# Altium integrated library PlantiumIntegratedLibrary.IntLib: 638 symbols (part 3 of 6) (continued)
## SC-A20-BGA-X (continued)

## SC-AD7195BCP
designator U?, comment AD7195BCPZ  (value not drawn)
1 Channel AFE 24 Bit 32-LFCSP (5x5); Manufacturer: Analog Devices Inc.; Working Temperature: -40°C to +105°C; Temperature Coefficient: NC; Short Description: IC AFE 1 CHAN 24BIT 32LFCSP; Ratings: ROHS3; EAR99; 8542.39.0001; Frequency: 4.92MHz; Current: 6mA; Voltage: 5V / 2.7V-5V; Value: 24 Bits; Manufacturer Part Number: AD7195BCPZ; Mounting: SMD; Power: NC; Type: Sigma-Delta; Alternate Part Number 1: *; Alternate Part Number 2: *; Tolerance: NC; Revision Date: 04/05/2023; Package Reference: 32-LFCSP (5x5); ComponentLink1Description: Datasheet; ComponentLink1URL: https://www.analog.com/media/en/technical-documentation/data-sheets/AD7195.pdf; ComponentLink2Description: Reference design; ComponentLink2URL: https://www.analog.com/media/en/reference-design-documentation/reference-designs/CN0155.pdf
footprint CP_32_11_ADI-M
pins: 1 ACX2 (out), 2 ~{ACX2} (out), 3 ACX1 (out), 4 ~{ACX1} (out), 5 AVDD (power), 6 AGND (power), 7 NC, 8 AINCOM (in), 9 AIN1 (in), 10 AIN2 (in), 11 NC, 12 NC, 13 NC, 14 NC, 15 AIN3 (in), 16 AIN4 (in), 17 REFIN(+) (in), 18 REFIN(-) (in), 19 NC, 20 BPDSW, 21 AGND (power), 22 DGND (power), 23 AVDD (power), 24 DVDD (power), 25 ~{SYNC} (in), 26 NC, 27 DOUT/~{RDY} (out), 28 DIN (in), 29 MCLK1, 30 MCLK2, 31 SCLK (in), 32 ~{CS} (in), HTAB EPAD

## SC-AD8574ARU
designator U?
Zero-Drift Amplifier 4 Circuit Rail-to-Rail 14-TSSOP; Manufacturer Part Number: AD8574ARUZ; Manufacturer: Analog Devices Inc.; Working Temperature: -40°C ~ 125°C; Temperature Coefficient: NC; Short Description: IC OPAMP ZER-DRIFT 4CIRC 14TSSOP; Ratings: REACH, ROHS3; Voltage: 2.7V ~ 5V; Value: NC; Mounting: SMT; Power: NC; Type: NC; Frequency: NC; Alternate Part Number 1: *; Alternate Part Number 2: *; Tolerance: NC; Current: NC; Revision Date: 03/08/21; Package Reference: TSSOP-14
footprint TSSOP-14 (Footprint not found)
pins: 1 OUTA, 2 -INA, 3 +INA, 4 +V, 5 +INB, 6 -INB, 7 OUTB, 8 OUTC, 9 -INC, 10 +INC, 11 -V, 12 +IND, 13 -IND, 14 OUTD

## SC-AD8601ART
designator U?
General Purpose Amplifier 1 Circuit Rail-to-Rail SOT-23-5; Manufacturer Part Number: AD8601ARTZ-REEL7; Manufacturer: Analog Devices Inc.; Working Temperature: -40°C ~ 125°C; Temperature Coefficient: NC; Short Description: OPERATIONAL AMPLIFIER, 2100UV OF; Ratings: ND; Voltage: 2.7V ~ 5.5V; Value: NC; Mounting: SMT; Power: NC; Type: NC; Frequency: NC; Alternate Part Number 1: *; Alternate Part Number 2: *; Tolerance: NC; Current: NC; Revision Date: 03/08/21; Package Reference: SOT-23-5
footprint SOT-23-5 (Footprint not found)
pins: 1 OUT A, 2 V-, 3 +IN, 4 -IN, 5 V+

## SC-AD8602ARM
designator U?
CMOS Amplifier 2 Circuit Rail-to-Rail 8-MSOP; Manufacturer Part Number: AD8602ARMZ-REEL; Manufacturer: Analog Devices Inc.; Working Temperature: -40°C ~ 125°C; Temperature Coefficient: NC; Short Description: IC OPAMP GP 2 CIRCUIT 8MSOP; Ratings: REACH, ROHS3; Voltage: 2.7V ~ 5.5V; Value: NC; Mounting: SMT; Power: NC; Type: NC; Frequency: NC; Alternate Part Number 1: *; Alternate Part Number 2: *; Tolerance: NC; Current: NC; Revision Date: 03/08/21; Package Reference: MSOP-8
footprint MSOP-8 (Footprint not found)
pins: 1 OUT A, 2 -IN A, 3 +IN A, 4 V-, 5 +IN B, 6 -IN B, 7 OUT B, 8 V+

## SC-AD8639ACPZ
designator U?
Chopper (Zero-Drift) Amplifier 2 Circuit Rail-to-Rail 8-LFCSP-WD (3x3); Manufacturer Part Number: AD8639ACPZ; Manufacturer: Analog Devices Inc.; Working Temperature: -40°C ~ 125°C; Temperature Coefficient: NC; Short Description: ND; Ratings: REACH, ROHS3; Voltage: 5V ~ 16V, ±2.5V ~ 8V; Value: NC; Mounting: SMT; Power: NC; Type: NC; Frequency: NC; Alternate Part Number 1: *; Alternate Part Number 2: *; Tolerance: NC; Current: NC; Revision Date: 24/08/21; Package Reference: MSOP-8
footprint DFN-8_3x3
pins: 1 VoutA, 2 VinA-, 3 VinA+, 4 Vss, 5 Vinb+, 6 Vinb-, 7 VoutB, 8 Vdd, 9 EP

## SC-AD8639ARM
designator U?
Chopper (Zero-Drift) Amplifier 2 Circuit Rail-to-Rail 8-MSOP; Manufacturer Part Number: AD8639ARMZ-REEL; Manufacturer: Analog Devices Inc.; Working Temperature: -40°C ~ 125°C; Temperature Coefficient: NC; Short Description: ND; Ratings: REACH, ROHS3; Voltage: 5V ~ 16V, ±2.5V ~ 8V; Value: NC; Mounting: SMT; Power: NC; Type: NC; Frequency: NC; Alternate Part Number 1: *; Alternate Part Number 2: *; Tolerance: NC; Current: NC; Revision Date: 03/08/21; Package Reference: MSOP-8
footprint MSOP-8
pins: 1 VoutA, 2 VinA-, 3 VinA+, 4 Vss, 5 Vinb+, 6 Vinb-, 7 VoutB, 8 Vdd

## SC-AD8639ARZ
designator U?
Chopper (Zero-Drift) Amplifier 2 Circuit Rail-to-Rail 8-SOIC; Manufacturer Part Number: AD8639ARZ; Manufacturer: Analog Devices Inc.; Working Temperature: -40°C ~ 125°C; Temperature Coefficient: NC; Short Description: ND; Ratings: REACH, ROHS3; Voltage: 5V ~ 16V, ±2.5V ~ 8V; Value: NC; Mounting: SMT; Power: NC; Type: NC; Frequency: NC; Alternate Part Number 1: *; Alternate Part Number 2: *; Tolerance: NC; Current: NC; Revision Date: 24/08/21; Package Reference: SOIC-8N
footprint SOIC-8N
pins: 1 VoutA, 2 VinA-, 3 VinA+, 4 Vss, 5 Vinb+, 6 Vinb-, 7 VoutB, 8 Vdd

## SC-ADG706BRU
designator U?
1 Circuit IC Switch 16:1 4.5Ohm 28-TSSOP; Manufacturer Part Number: ADG706BRUZ; Manufacturer: Analog Devices Inc.; Working Temperature: -40°C ~ 85°C (TA); Temperature Coefficient: NC; Short Description: IC MULTIPLEXER 16X1 28TSSOP; Ratings: REACH, ROHS3; Voltage: 1.8V ~ 5.5V; Value: NC; Mounting: SMT; Power: NC; Type: NC; Frequency: NC; Alternate Part Number 1: *; Alternate Part Number 2: *; Tolerance: NC; Current: NC; Revision Date: 03/08/21; Package Reference: TSSOP-28
footprint TSSOP-28 (Footprint not found)
pins: 1 VDD, 2 NC, 3 NC, 4 S16, 5 S15, 6 S14, 7 S13, 8 S12, 9 S11, 10 S10, 11 S9, 12 GND, 13 NC, 14 A3, 15 A2, 16 A1, 17 A0, 18 EN, 19 S1, 20 S2, 21 S3, 22 S4, 23 S5, 24 S6, 25 S7, 26 S8, 27 VSS, 28 D

## SC-ADR445BRZ
designator U?
Series Voltage Reference IC ±0.04% 8-SOIC; Manufacturer Part Number: ADR445BRZ; Manufacturer: Analog Devices Inc.; Working Temperature: -40°C ~ 125°C (TA); Temperature Coefficient: NC; Short Description: IC VREF SERIES 0.04% 8SOIC; Ratings: REACH, ROHS3; Voltage: 5.5V ~ 18V; Value: NC; Mounting: SMT; Power: NC; Type: NC; Frequency: NC; Alternate Part Number 1: *; Alternate Part Number 2: *; Tolerance: NC; Current: NC; Revision Date: 03/08/21; Package Reference: SOIC-8N
footprint SOIC-8N (Footprint not found)
pins: 1 TP, 2 VIN, 3 NC, 4 GND, 5 TRIM, 6 VOUT, 7 NC, 8 TP

## SC-ADS1115BQ
designator U?, comment ADS1115-Q1
Automotive 16-Bit 860SPS 4-Ch Delta-Sigma ADC With PGA, Oscillator, VREF, Comparator, and I2C; Manufacturer_Name: Texas Instruments; Manufacturer_Part_Number: ADS1115BQDGSRQ1; Geometry.Height: 1.1mm; Mouser Part Number: 595-ADS1115BQDGSRQ1; Datasheet Link: http://www.ti.com/lit/gpn/ads1115-q1
footprint VSSOP-10
pins: 1 ADDR (in), 2 ALERT/RDY, 3 GND, 4 AIN0 (in), 5 AIN1 (in), 6 AIN2 (in), 7 AIN3 (in), 8 VDD, 9 SDA, 10 SCL

## SC-ADS1235QW
designator U?
24 Bit Analog to Digital Converter 3, 5 Input 1 Sigma-Delta 32-VQFN (5x5); Manufacturer Part Number: ADS1235QWRHMRQ1; Manufacturer: Texas Instruments; Working Temperature: -40°C ~ 125°C; Temperature Coefficient: NC; Short Description: IC ADC 24BIT SIGMA-DELTA 32VQFNP; Voltage: 2.7V ~ 5.25V; Value: NC; Mounting: Surface Mount; Power: NC; Ratings: *; Type: NC; Frequency: NC; Alternate Part Number 1: *; Alternate Part Number 2: *; Tolerance: NC; Current: NC; Revision Date: *; Package Reference: 32-VQFN (5x5)
footprint VQFN-32_5x5 (32-VFQFN Exposed Pad)
pins: 1 NC, 2 CAPP (out), 3 CAPN (out), 4 AVDD (power), 5 AVSS, 6 NC, 7 ~{PWDN} (in), 8 ~{RESET} (in), 9 START (in), 10 ~{CS} (in), 11 SCLK (in), 12 DIN (in), 13 ~{DRDY} (out), 14 DOUT/~{DRDY} (out), 15 BYPASS (out), 16 DGND, 17 DVDD (power), 18 CLKIN (in), 19 NC, 20 NC, 21 NC, 22 NC, 23 NC, 24 NC, 25 AIN5 (in), 26 AIN4 (in), 27 AIN3 (io), 28 AIN2 (io), 29 AIN1 (io), 30 AIN0 (io), 31 REFN0 (io), 32 REFP0 (io), 33 AVSS

## SC-ADUM4195
designator U?  (value not drawn)
HIGH STABILITY ISOLATED ERROR AM; Manufacturer Part Number: ADUM4195-1BRIZ; Manufacturer: Analog Devices Inc.; Working Temperature: -40°C ~ 125°C; Temperature Coefficient: NC; Short Description: Isolator, Error Amplifier IC Automotive 8-SOIC-IC; Ratings: REACH, ROHS3; Voltage: 4.5V ~ 5.5V; Value: NC; Mounting: SMT; Power: NC; Type: NC; Frequency: NC; Alternate Part Number 1: *; Alternate Part Number 2: *; Tolerance: NC; Current: NC; Revision Date: 03/08/21; Package Reference: SOIC-8N
footprint SOIC-8W
pins: 1 VDD2, 2 VIN, 3 SHTD, 4 GND2, 5 GND, 6 NC, 7 VOUT, 8 VDD1

## SC-AL8860MPX
designator U?  (value not drawn)
LED Driver IC 1 Output DC DC Regulator Step-Down (Buck) Analog, PWM Dimming 1.5A 8-MSOP-EP; Manufacturer Part Number: AL8860MP-13; Manufacturer: Diodes Incorporated; Working Temperature: -40°C ~ 105°C (TA); Temperature Coefficient: NC; Short Description: IC LED DRVR 8MSOP; Ratings: REACH, ROHS3; Frequency: 1MHZ; Voltage: 4.5V ~ 40V; Value: 36V; Mounting: SMT; Power: NC; Type: NC; Alternate Part Number 1: *; Alternate Part Number 2: *; Tolerance: NC; Current: 1.5A; Revision Date: 03/08/21; Package Reference: 8-MSOP-EP
footprint R-PDSO-G8 (8-TSSOP, 8-MSOP (0.118", 3.00mm Width) Exposed Pad)
pins: 1 SET, 2 GND, 3 GND, 4 CTRL, 5 SW, 6 SW, 7 NC, 8 VIN, 9 EP

## SC-AS5306A-A
designator U?
Rotary Encoder Magnetic 1280 Quadrature (Incremental) -; Manufacturer Part Number: AS5306A-ATSU; Manufacturer: ams; Working Temperature: -40°C ~ 125°C (TA); Temperature Coefficient: NC; Short Description: ROTARY ENCODER MAGNETIC 1280PPR; Ratings: REACH; Voltage: 4.5V ~ 5.5V; Value: NC; Mounting: SMT; Power: NC; Type: NC; Frequency: NC; Alternate Part Number 1: *; Alternate Part Number 2: *; Tolerance: NC; Current: NC; Revision Date: 03/08/21; Package Reference: TSSOP-20
footprint TSSOP-20 (Footprint not found)
pins: 1 VSS, 2 A, 3 VDDP, 4 B, 5 TEST, 6 AO, 7 VDD, 8 INDEX, 9 NC, 10 NC, 11 NC, 12 TEST, 13 TEST, 14 TEST, 15 TEST_GND, 16 VDDA, 17 TEST, 18 TEST, 19 TEST, 20 ZPZ

## SC-AT25DF641
designator U?, comment OBSOLETO  (value not drawn)
FLASH Memory IC 64Mb (256 Bytes x 32K pages) SPI 100MHz 8-SOIC; Manufacturer Part Number: AT25DF641A-SH-B; Manufacturer: Adesto Technologies; Working Temperature: -40°C ~ 85°C (TC); Temperature Coefficient: NC; Short Description: IC FLASH 64MBIT SPI 100MHZ 8SOIC; Ratings: ROHS3; Voltage: 2.7V ~ 3.6V; Value: NC; Mounting: SMT; Power: NC; Type: NC; Frequency: NC; Alternate Part Number 2: *; Tolerance: NC; Current: NC; Revision Date: 03/08/21; Package Reference: SOIC-8N
footprint SOIC-8N
pins: 1 ~{CS}, 2 SO, 3 ~{WP}, 4 GND, 5 SI, 6 SCK, 7 ~{HOLD}, 8 VCC

## SC-AT26DF161
designator U?
FLASH Memory IC 16Mb (256 Bytes x 8192 pages) SPI 66 MHz 8-SOIC; Manufacturer Part Number: AT26DF161-SU; Manufacturer: Microchip Technology; Working Temperature: -40°C ~ 85°C (TC); Temperature Coefficient: NC; Short Description: IC FLASH 16MBIT SPI 66MHZ 8SOIC; Ratings: REACH, ROHS3; Voltage: 2.7V ~ 3.6V; Value: NC; Mounting: SMT; Power: NC; Type: NC; Frequency: NC; Alternate Part Number 1: *; Alternate Part Number 2: *; Tolerance: NC; Current: NC; Revision Date: 03/08/21; Package Reference: SOIC-8N
footprint SOIC-8N (Footprint not found)
pins: 1 ~{CS}, 2 SO, 3 ~{WP}, 4 GND, 5 SI, 6 SCK, 7 ~{HOLD}, 8 VCC

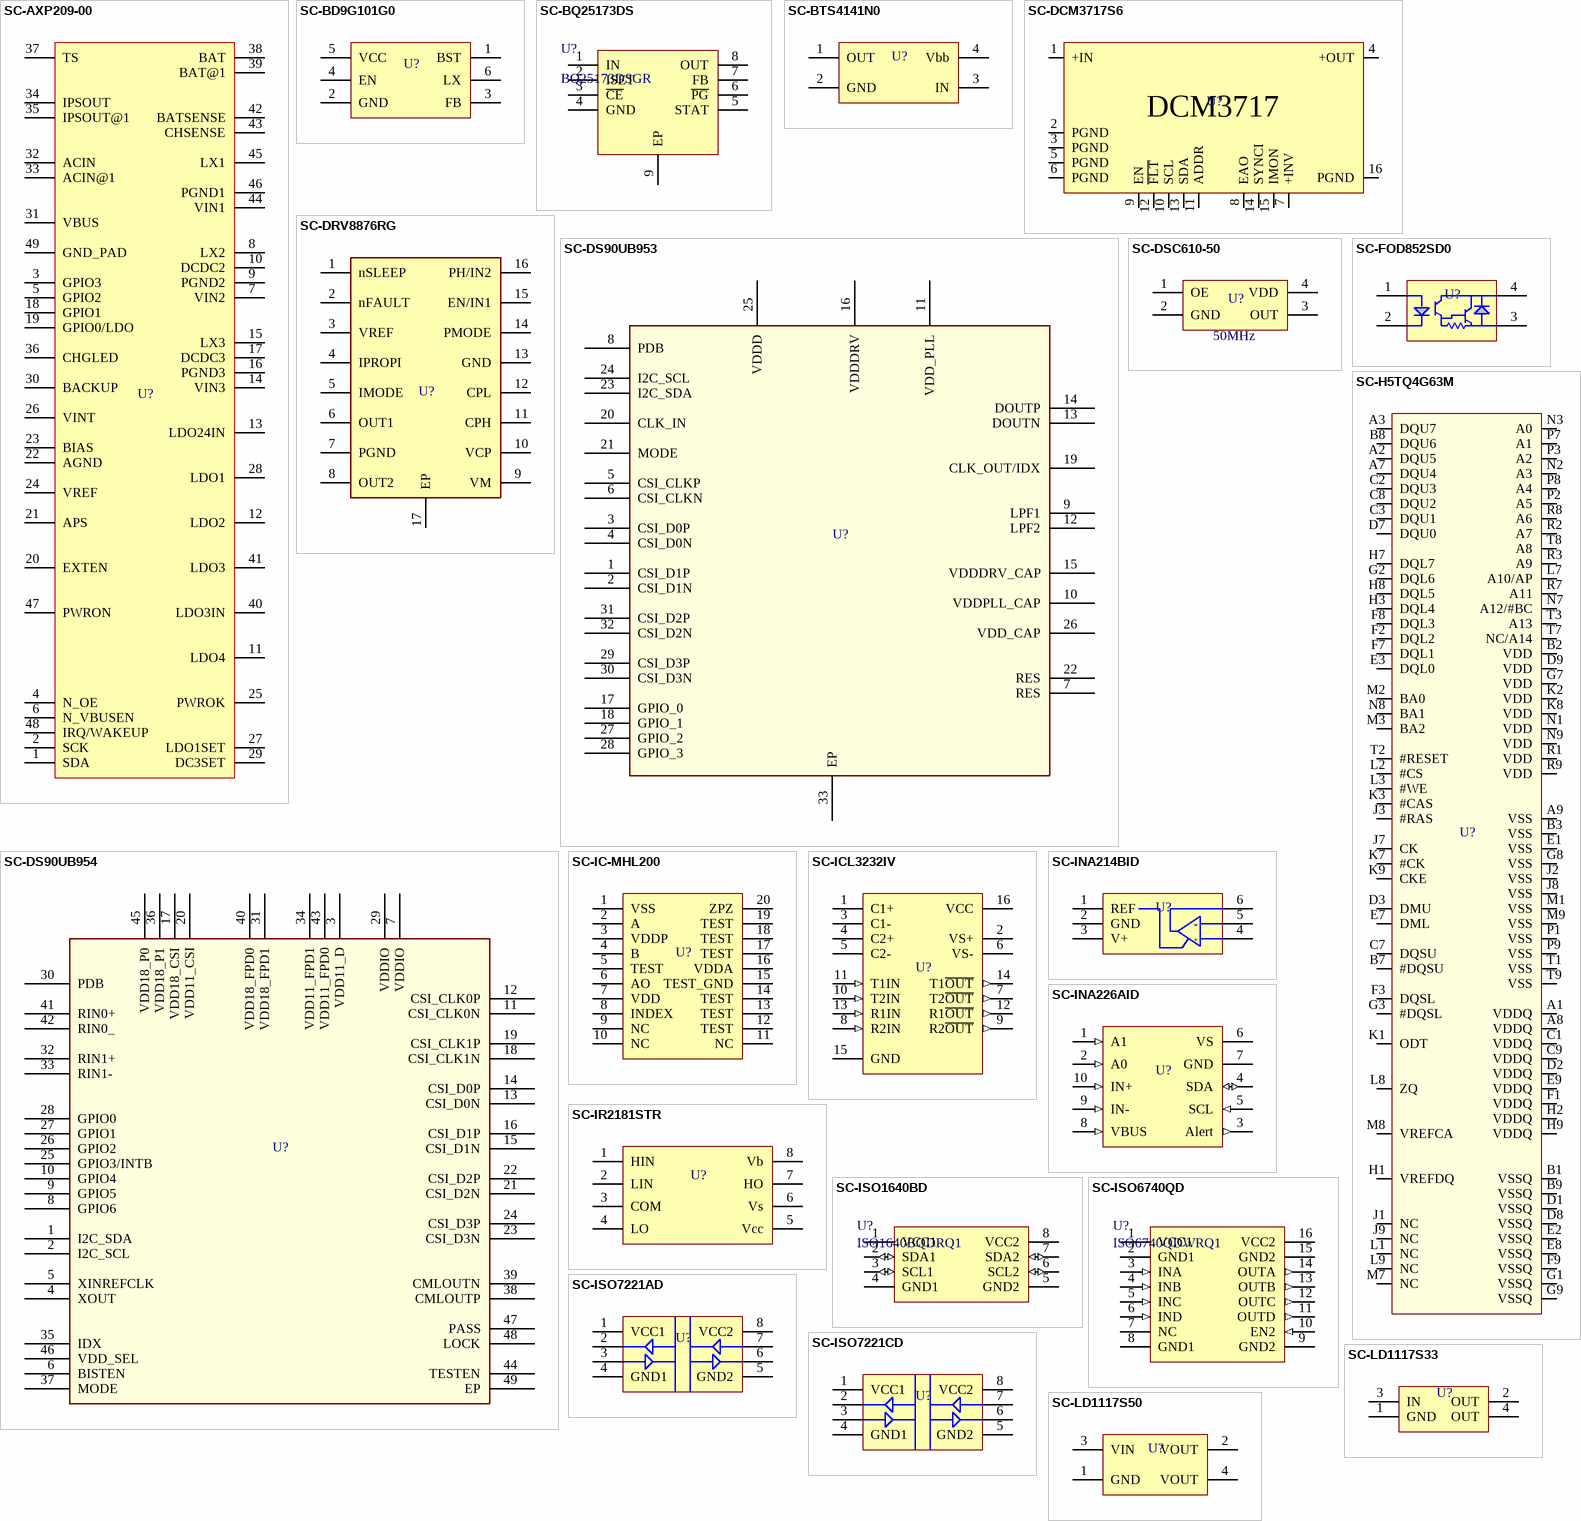
[diagram p16: symbols SC-AXP209-00 to SC-LD1117S50]

## SC-AXP209-00
designator U?
Enhanced single Cell Li-Battery and Power System Management IC; Manufacturer Part Number: AXP209; Working Temperature: -40°C ~ 130°C (TJ); Temperature Coefficient: NC; Short Description: ND; Voltage: 2.9V ~ 6.3V; Value: NC; Mounting: SMT; Power: NC; Ratings: *; Type: NC; Frequency: NC; Alternate Part Number 1: *; Alternate Part Number 2: *; Manufacturer: ND; Tolerance: NC; Current: NC; Revision Date: 03/08/21; Package Reference: PQFN-48_6X6
footprint PQFN-48_6X6
pins: 1 SDA, 2 SCK, 3 GPIO3, 4 N_OE, 5 GPIO2, 6 N_VBUSEN, 7 VIN2, 8 LX2, 9 PGND2, 10 DCDC2, 11 LDO4, 12 LDO2, 13 LDO24IN, 14 VIN3, 15 LX3, 16 PGND3, 17 DCDC3, 18 GPIO1, 19 GPIO0/LDO, 20 EXTEN, 21 APS, 22 AGND, 23 BIAS, 24 VREF, 25 PWROK, 26 VINT, 27 LDO1SET, 28 LDO1, 29 DC3SET, 30 BACKUP, 31 VBUS, 32 ACIN, 33 ACIN@1, 34 IPSOUT, 35 IPSOUT@1, 36 CHGLED, 37 TS, 38 BAT, 39 BAT@1, 40 LDO3IN, 41 LDO3, 42 BATSENSE, 43 CHSENSE, 44 VIN1, 45 LX1, 46 PGND1, 47 PWRON, 48 IRQ/WAKEUP, 49 GND_PAD

## SC-BD9G101G0
designator U?
Buck Switching Regulator IC Positive Adjustable 1V 1 Output 500mA SOT-23-6; Manufacturer Part Number: BD9G101G-TR; Manufacturer: Rohm Semiconductor; Working Temperature: -40°C ~ 105°C (TA); Temperature Coefficient: NC; Short Description: IC REG BUCK ADJ 500MA 6SSOP; Ratings: REACH, ROHS3; Frequency: 1.5MHz; Voltage: 6V ~ 42V; Value: NC; Mounting: SMT; Power: NC; Type: Buck; Alternate Part Number 1: *; Alternate Part Number 2: *; Tolerance: NC; Current: 500mA; Revision Date: 03/08/21; Package Reference: SOT-23-6
footprint SOT-23-6 (Footprint not found)
pins: 1 BST, 2 GND, 3 FB, 4 EN, 5 VCC, 6 LX

## SC-BQ25173DS
designator U?, comment BQ25173DSGR
Battery Management 800-mA linear charger for 1-cell to 4-cell supercapacitor; Manufacturer_Name: Texas Instruments; Datasheet Link: https://www.ti.com/lit/ds/symlink/bq25173.pdf?ts=1639457789781&ref_url=https%253A%252F%252Fwww.ti.com%252Fproduct%252FBQ25173%253FkeyMatch%253DBQ25173DSGR%2526tisearch%253Dsearch-everything%2526usecase%253DOPN; Height: 0.8mm; Manufacturer_Part_Number: BQ25173DSGR; Mounting: SMT
footprint WSON-8
pins: 1 IN, 2 ISET, 3 ~{CE}, 4 GND, 5 STAT, 6 ~{PG}, 7 FB, 8 OUT, 9 EP

## SC-BTS4141N0
designator U?
Power Switch/Driver 1:1 N-Channel 700mA PG-SOT223-4; Manufacturer Part Number: BTS4141NHUMA1; Alternate Part Number 1: BTS4141NNT; Manufacturer: Infineon Technologies; Working Temperature: -40°C ~ 125°C (TJ); Temperature Coefficient: NC; Short Description: IC PWR SWTCH N-CHAN 1:1 SOT223-4; Ratings: REACH, ROHS3; Voltage: 12V ~ 45V; Value: NC; Mounting: SMT; Power: NC; Type: High Side; Frequency: NC; Alternate Part Number 2: *; Tolerance: NC; Current: 700mA; Revision Date: 03/08/21; Package Reference: SOT-223
footprint SOT-223 (Footprint not found)
pins: 1 OUT, 2 GND, 3 IN, 4 Vbb

## SC-DCM3717S6
designator U?
Non-Isolated PoL Module DC DC Converter Output 12.2V 62.5A 40V - 60V Input; Manufacturer Part Number: DCM3717S60E14G5TN0; Manufacturer: Vicor Corporation; Working Temperature: -20°C ~ 125°C; Temperature Coefficient: NC; Short Description: DC DC CONVERTER 12.2V 750W; Power: 750W; Ratings: ROHS3; Value: NC; Mounting: SMT; Type: NC; Frequency: NC; Alternate Part Number 1: *; Alternate Part Number 2: *; Tolerance: NC; Current: NC; Revision Date: 02/09/21; Package Reference: DCM3717; Voltage: NC
footprint DCM3717
pins: 1 +IN, 2 PGND, 3 PGND, 4 +OUT, 5 PGND, 6 PGND, 7 +INV, 8 EAO, 9 EN, 10 SCL, 11 ADDR, 12 ~{FLT}, 13 SDA, 14 SYNCI, 15 IMON, 16 PGND

## SC-DRV8876RG
designator U?
Unipolar Motor Driver NMOS PWM 16-VQFN (3x3); Manufacturer Part Number: DRV8876RGTR; Manufacturer: Texas Instruments; Working Temperature: -40°C ~ 125°C; Temperature Coefficient: NC; Short Description: IC MOTOR DRIVER DC 5.5V 16VQFN; Ratings: REACH, ROHS3; Current: 3.5A; Voltage: 4.5V ~ 37V; Value: NC; Mounting: SMT; Power: NC; Type: NC; Frequency: NC; Alternate Part Number 1: *; Alternate Part Number 2: *; Tolerance: NC; Revision Date: 05/08/22; Package Reference: 16-VQFN (3x3); ComponentLink1Description: Data Sheet; ComponentLink1URL: https://www.ti.com/lit/ds/symlink/drv8876.pdf?ts=1659683804846&ref_url=https%253A%252F%252Fwww.google.com%252F
footprint DRV8876R
pins: 1 nSLEEP, 2 nFAULT, 3 VREF, 4 IPROPI, 5 IMODE, 6 OUT1, 7 PGND, 8 OUT2, 9 VM, 10 VCP, 11 CPH, 12 CPL, 13 GND, 14 PMODE, 15 EN/IN1, 16 PH/IN2, 17 EP

## SC-DS90UB953
designator U?
4.16Gbps Serializer 1 Input 1 Output 32-VQFN (5x5); Manufacturer Part Number: DS90UB954TRGZTQ1; Alternate Part Number 1: DS90UB953TRHBRQ1; Manufacturer: Texas Instruments; Working Temperature: -40°C ~ 105°C; Temperature Coefficient: NC; Ratings: REACH, AEC-Q100, ROHS3; Value: NC; Mounting: SMT; Short Description: 4.16Gbps Serializer 1 Input 1 Output 32-VQFN (5x5); Power: NC; Type: CSI-2, MIPI; Frequency: NC; Alternate Part Number 2: *; Tolerance: NC; Current: NC; Revision Date: 13/04/23; Package Reference: 32-VQFN (5x5); Voltage: NC
footprint 32-VQFN (5x5) (Stencil de espesor 5mil)
pins: 1 CSI_D1P, 2 CSI_D1N, 3 CSI_D0P, 4 CSI_D0N, 5 CSI_CLKP, 6 CSI_CLKN, 7 RES, 8 PDB, 9 LPF1, 10 VDDPLL_CAP, 11 VDD_PLL, 12 LPF2, 13 DOUTN, 14 DOUTP, 15 VDDDRV_CAP, 16 VDDDRV, 17 GPIO_0, 18 GPIO_1, 19 CLK_OUT/IDX, 20 CLK_IN, 21 MODE, 22 RES, 23 I2C_SDA, 24 I2C_SCL, 25 VDDD, 26 VDD_CAP, 27 GPIO_2, 28 GPIO_3, 29 CSI_D3P, 30 CSI_D3N, 31 CSI_D2P, 32 CSI_D2N, 33 EP

## SC-DS90UB954
designator U?
1.5Gbps Deserializer 2 Input Output 48-VQFN (7x7); Manufacturer Part Number: DS90UB954TRGZTQ1; Alternate Part Number 1: DS90UB954TRGZRQ1; Manufacturer: Texas Instruments; Working Temperature: -40°C ~ 105°C; Temperature Coefficient: NC; Short Description: 12-BIT 100MHFPD-LINK III DESERIA; Ratings: REACH, AEQ-101, ROHS3; Value: NC; Mounting: SMT; Power: NC; Type: CSI-2, MIPI; Frequency: NC; Alternate Part Number 2: *; Tolerance: NC; Current: NC; Revision Date: 10/08/22; Package Reference: 48-VQFN (7x7); Voltage: NC
footprint 48-VQFN (7x7)
pins: 1 I2C_SDA, 2 I2C_SCL, 3 VDD11_D, 4 XOUT, 5 XINREFCLK, 6 BISTEN, 7 VDDIO, 8 GPIO6, 9 GPIO5, 10 GPIO4, 11 CSI_CLK0N, 12 CSI_CLK0P, 13 CSI_D0N, 14 CSI_D0P, 15 CSI_D1N, 16 CSI_D1P, 17 VDD18_CSI, 18 CSI_CLK1N, 19 CSI_CLK1P, 20 VDD11_CSI, 21 CSI_D2N, 22 CSI_D2P, 23 CSI_D3N, 24 CSI_D3P, 25 GPIO3/INTB, 26 GPIO2, 27 GPIO1, 28 GPIO0, 29 VDDIO, 30 PDB, 31 VDD18_FPD1, 32 RIN1+, 33 RIN1-, 34 VDD11_FPD1, 35 IDX, 36 VDD18_P1, 37 MODE, 38 CMLOUTP, 39 CMLOUTN, 40 VDD18_FPD0, 41 RIN0+, 42 RIN0_, 43 VDD11_FPD0, 44 TESTEN, 45 VDD18_P0, 46 VDD_SEL, 47 PASS, 48 LOCK, 49 EP

## SC-DSC610-50
designator U?  value 50MHz
50 MHz XO (Standard) CMOS Oscillator 1.8V ~ 3.3V Enable/Disable 4-SMD, No Lead; Manufacturer Part Number: DSC6101JI2A-050.0000T; Manufacturer: Microchip Technology; Working Temperature: -40°C ~ 85°C; Temperature Coefficient: NC; Short Description: MEMS OSC XO 50.0000MHZ CMOS SMD; Ratings: AEC-Q100/ROHS3/REACH; Tolerance: ±25ppm; Current: 3mA (Typ); Voltage: 2V ~ 5.5V; Mounting: SMT; Power: NC; Type: XO Standar; Frequency: NC; Alternate Part Number 1: *; Alternate Part Number 2: *; Revision Date: 09/05/23; Package Reference: VLGA 2.5x2mm
footprint VLGA 2.5x2mm (Footprint not found)
pins: 1 OE, 2 GND, 3 OUT, 4 VDD

## SC-FOD852SD0
designator U?
Optoisolator Darlington Output 5000Vrms 1 Channel 4-SMD; Manufacturer Part Number: FOD852SD; Manufacturer: ON Semiconductor; Working Temperature: -30°C ~ 100°C; Temperature Coefficient: NC; Short Description: OPTOISOLATOR 5KV DARLINGTON 4SMD; Ratings: REACH, ROHS3; Current: 150mA; Voltage: 300V; Value: NC; Mounting: SMT; Power: NC; Type: Darlington; Frequency: NC; Alternate Part Number 1: *; Alternate Part Number 2: *; Tolerance: NC; Revision Date: 03/08/21; Package Reference: DIP-4SMD
footprint DIP-4SMD (Footprint not found)
pins: 1 CATHODE, 2 ANODE, 3 ANODE, 4 ANODE

## SC-H5TQ4G63M
designator U?
DRAM chip DDR3 SDRAM 4GBIT 1.5V 96-pin FBGA; Manufacturer Part Number: H5TQ4G63AFR-H9I; Manufacturer: SKHynix; Working Temperature: NC; Short Description: DDR3 256M x 16 - 96ball FBGA; Ratings: ROHS; Frequency: 667~1333MHz; Voltage: 1.5V +/- 0.075V; Value: NC; Temperature Coefficient: NC; Mounting: SMT; Power: NC; Type: DDR3; Alternate Part Number 1: *; Alternate Part Number 2: *; Tolerance: NC; Current: NC; Revision Date: 03/08/21; Package Reference: *
footprint FBGA-96_MEM
pins: A1 VDDQ, A2 DQU5, A3 DQU7, A7 DQU4, A8 VDDQ, A9 VSS, B1 VSSQ, B2 VDD, B3 VSS, B7 #DQSU, B8 DQU6, B9 VSSQ, C1 VDDQ, C2 DQU3, C3 DQU1, C7 DQSU, C8 DQU2, C9 VDDQ, D1 VSSQ, D2 VDDQ, D3 DMU, D7 DQU0, D8 VSSQ, D9 VDD, E1 VSS, E2 VSSQ, E3 DQL0, E7 DML, E8 VSSQ, E9 VDDQ, F1 VDDQ, F2 DQL2, F3 DQSL, F7 DQL1, F8 DQL3, F9 VSSQ, G1 VSSQ, G2 DQL6, G3 #DQSL, G7 VDD, G8 VSS, G9 VSSQ, H1 VREFDQ, H2 VDDQ, H3 DQL4, H7 DQL7, H8 DQL5, H9 VDDQ, J1 NC, J2 VSS, J3 #RAS, J7 CK, J8 VSS, J9 NC, K1 ODT, K2 VDD, K3 #CAS, K7 #CK, K8 VDD, K9 CKE, L1 NC, L2 #CS, L3 #WE, L7 A10/AP, L8 ZQ, L9 NC, M1 VSS, M2 BA0, M3 BA2, M7 NC, M8 VREFCA, M9 VSS, N1 VDD, N2 A3, N3 A0, N7 A12/#BC, N8 BA1, N9 VDD, P1 VSS, P2 A5, P3 A2, P7 A1, P8 A4, P9 VSS, R1 VDD, R2 A7, R3 A9, R7 A11, R8 A6, R9 VDD, T1 VSS, T2 #RESET, T3 A13, T7 NC/A14, T8 A8, T9 VSS

## SC-IC-MHL200
designator U?
12-BIT LINEAR / ROTARY POSITION HALL ENCODER; Manufacturer Part Number: IC-MHL200; Manufacturer: ICHaus; Working Temperature: -40 to +125 °C; Temperature Coefficient: NC; Short Description: ND; Ratings: ROHS, AEQ-100; Value: NC; Mounting: SMT; Power: NC; Type: NC; Frequency: NC; Alternate Part Number 1: *; Alternate Part Number 2: *; Tolerance: NC; Current: NC; Revision Date: 03/08/21; Package Reference: TSSOP-20; Voltage: NC
footprint TSSOP-20 (Footprint not found)
pins: 1 VSS, 2 A, 3 VDDP, 4 B, 5 TEST, 6 AO, 7 VDD, 8 INDEX, 9 NC, 10 NC, 11 NC, 12 TEST, 13 TEST, 14 TEST, 15 TEST_GND, 16 VDDA, 17 TEST, 18 TEST, 19 TEST, 20 ZPZ

## SC-ICL3232IV
designator U?
2/2 Transceiver Full RS232 16-TSSOP; Manufacturer Part Number: ICL3232IVZ; Manufacturer: Renesas Electronics America Inc; Working Temperature: -40°C ~ 85°C; Temperature Coefficient: NC; Short Description: ND; Ratings: REACH, ROHS3; Frequency: 250kbps; Voltage: 3V ~ 5.5V; Value: NC; Mounting: SMT; Power: NC; Type: RS232; Alternate Part Number 1: *; Alternate Part Number 2: *; Tolerance: NC; Current: NC; Revision Date: 03/08/21; Package Reference: TSSOP-16
footprint TSSOP-16 (Footprint not found)
pins: 1 C1+, 2 VS+ (power), 3 C1-, 4 C2+, 5 C2-, 6 VS- (power), 7 T2~{OUT} (out), 8 R2IN (in), 9 R2~{OUT} (out), 10 T2IN (in), 11 T1IN (in), 12 R1~{OUT} (out), 13 R1IN (in), 14 T1~{OUT} (out), 15 GND (power), 16 VCC (power)

## SC-INA214BID
designator U?
Current Sense Amplifier 1 Circuit - SC-70-6; Manufacturer Part Number: INA214BIDCKR; Manufacturer: Texas Instruments; Working Temperature: -40°C ~ 125°C; Temperature Coefficient: NC; Short Description: IC CURR SENSE 1 CIRCUIT SC70-6; Ratings: REACH, ROHS3; Voltage: 2.7V ~ 26V; Value: NC; Mounting: SMT; Power: NC; Type: NC; Frequency: NC; Alternate Part Number 1: *; Alternate Part Number 2: *; Tolerance: NC; Current: NC; Revision Date: 03/08/21; Package Reference: SOT-363-6
footprint SOT-363-6 (Footprint not found)
pins: 1 REF, 2 GND, 3 V+, 4 IN+, 5 IN-, 6 OUT
text: -; +

## SC-INA226AID
designator U?
Current Monitor Regulator High/Low-Side 10mA 10-VSSOP; Manufacturer Part Number: INA226AIDGSR; Alternate Part Number 1: INA226AQDGSRQ1; Manufacturer: Texas Instruments; Working Temperature: -40°C ~ 125°C; Temperature Coefficient: NC; Short Description: IC CURRENT MONITOR 0.02% 10VSSOP; Ratings: ROHS3 Compliant, REACH Unaffected; Tolerance: ±0.02%; Voltage: 0V ~ 36V; Value: NC; Mounting: SMD; Power: NC; Type: Current Monitor High/Low-Side; Frequency: NC; Alternate Part Number 2: *; Current: 10mA; Revision Date: 12/06/2023; Package Reference: 10-TFSOP, 10-MSOP; ComponentLink1Description: Datasheet; ComponentLink1URL: https://www.ti.com/lit/ds/symlink/ina226.pdf; ComponentLink2Description: Evaluation module user guide; ComponentLink2URL: https://www.ti.com/lit/pdf/sbou276
footprint VSSOP-10
pins: 1 A1 (in), 2 A0 (in), 3 Alert (out), 4 SDA (io), 5 SCL (in), 6 VS (power), 7 GND (power), 8 VBUS (in), 9 IN- (in), 10 IN+ (in)

## SC-IR2181STR
designator U?
Half-Bridge Gate Driver IC Non-Inverting 8-SOIC; Manufacturer Part Number: IR2181STRPBF; Manufacturer: Infineon Technologies; Working Temperature: -40°C ~ 150°C (TJ); Temperature Coefficient: NC; Short Description: IC GATE DRVR HALF-BRIDGE 8SOIC; Ratings: REACH, ROHS3; Current: 1.9A, 2.3A; Voltage: 600V; Value: NC; Mounting: SMT; Power: NC; Type: Half-Bridge; Frequency: NC; Alternate Part Number 1: *; Alternate Part Number 2: *; Tolerance: NC; Revision Date: 03/08/21; Package Reference: SOIC-8N
footprint SOIC-8N (Footprint not found)
pins: 1 HIN, 2 LIN, 3 COM, 4 LO, 5 Vcc, 6 Vs, 7 HO, 8 Vb

## SC-ISO1640BD
designator U?, comment ISO1640BQDRQ1
Automotive, Hot-Swappable Bidirectional I2C Isolators with Enhanced EMC; Manufacturer_Name: Texas Instruments; Datasheet Link: https://www.ti.com/lit/ds/symlink/iso1640-q1.pdf?HQS=dis-mous-null-mousermode-dsf-pf-null-wwe&ts=1684139938505&ref_url=https%253A%252F%252Fwww.mouser.at%252F; Height: 2.65mm; Manufacturer_Part_Number: ISO1640BQDRQ1; Mounting: SMT
footprint SOIC-8N
pins: 1 VCC1 (power), 2 SDA1 (io), 3 SCL1 (io), 4 GND1 (power), 5 GND2 (power), 6 SCL2 (io), 7 SDA2 (io), 8 VCC2 (power)

## SC-ISO6740QD
designator U?, comment ISO6740QDWRQ1
General-Purpose Reinforced Quad-Channel Automotive Digital Isolators; Manufacturer_Name: Texas Instruments; Datasheet Link: https://www.ti.com/lit/ds/symlink/iso6741-q1.pdf?ts=1614655398955; Height: 2.65mm; Manufacturer_Part_Number: ISO6740QDWRQ1; Mounting: SMT
footprint SOIC-16W
pins: 1 VCC1 (power), 2 GND1 (power), 3 INA (in), 4 INB (in), 5 INC (in), 6 IND (in), 7 NC, 8 GND1 (power), 9 GND2 (power), 10 EN2 (in), 11 OUTD (out), 12 OUTC (out), 13 OUTB (out), 14 OUTA (out), 15 GND2 (power), 16 VCC2 (power)

## SC-ISO7221AD
designator U?
General Purpose Digital Isolator 2500Vrms Channel 1Mbps 25kV/µs CMTI 8-SOIC (0.154", 3.90mm Width); Manufacturer Part Number: ISO7221ADR; Manufacturer: Texas Instruments; Working Temperature: -40°C ~ 125°C; Temperature Coefficient: NC; Short Description: DGTL ISO 2500VRMS 2CH GP 8SOIC; Ratings: REACH, ROHS3; Voltage: 3V ~ 5.5V; Value: NC; Mounting: SMT; Power: NC; Type: Capacitive Coupling; Frequency: 1Mbps; Alternate Part Number 1: *; Alternate Part Number 2: *; Tolerance: NC; Current: NC; Revision Date: 03/08/21; Package Reference: SOIC-8N
footprint SOIC-8N (Footprint not found)
pins: 1 VCC1, 2 OUTA, 3 INB, 4 GND1, 5 GND2, 6 OUTB, 7 INA, 8 VCC2

## SC-ISO7221CD
designator U?
General Purpose Digital Isolator 2500Vrms Channel 25Mbps 25kV/µs CMTI 8-SOIC (0.154", 3.90mm Width); Manufacturer Part Number: ISO7221CDR; Manufacturer: Texas Instruments; Working Temperature: -40°C ~ 125°C; Temperature Coefficient: NC; Short Description: DGTL ISO 2500VRMS 2CH GP 8SOIC; Ratings: REACH, ROHS3; Voltage: 2.8V ~ 5.5V; Value: NC; Mounting: SMT; Power: NC; Type: Capacitive Coupling; Frequency: 25Mbps; Alternate Part Number 1: *; Alternate Part Number 2: *; Tolerance: NC; Current: NC; Revision Date: 03/08/21; Package Reference: SOIC-8N
footprint SOIC-8N (Footprint not found)
pins: 1 VCC1, 2 OUTA, 3 INB, 4 GND1, 5 GND2, 6 OUTB, 7 INA, 8 VCC2

## SC-LD1117S33
designator U?
Linear Voltage Regulator IC Positive Fixed 1 Output 800mA SOT-223; Manufacturer Part Number: LD1117S33CTR; Manufacturer: STMicroelectronics; Working Temperature: -40°C ~ 125°C; Temperature Coefficient: NC; Short Description: IC REG LINEAR 3.3V 800MA SOT223; Ratings: REACH, ROHS3; Voltage: 3.3V; Value: NC; Mounting: SMT; Power: NC; Type: Linear; Frequency: NC; Alternate Part Number 1: *; Alternate Part Number 2: *; Tolerance: NC; Current: 800mA; Revision Date: 03/08/21; Package Reference: SOT-223
footprint SOT-223 (Footprint not found)
pins: 1 GND (power), 2 OUT (power), 3 IN (power), 4 OUT

## SC-LD1117S50
designator U?
Linear Voltage Regulator IC Positive Fixed 1 Output 800mA SOT-223; Manufacturer Part Number: LD1117S50CTR; Manufacturer: STMicroelectronics; Working Temperature: -40°C ~ 125°C; Temperature Coefficient: NC; Short Description: IC REG LINEAR 5V 800MA SOT223; Ratings: REACH, ROHS3; Voltage: 5V; Value: NC; Mounting: SMT; Power: NC; Type: Linear; Frequency: NC; Alternate Part Number 1: *; Alternate Part Number 2: *; Tolerance: NC; Current: 800mA; Revision Date: 03/08/21; Package Reference: SOT-223
footprint SOT-223 (Footprint not found)
pins: 1 GND, 2 VOUT, 3 VIN, 4 VOUT

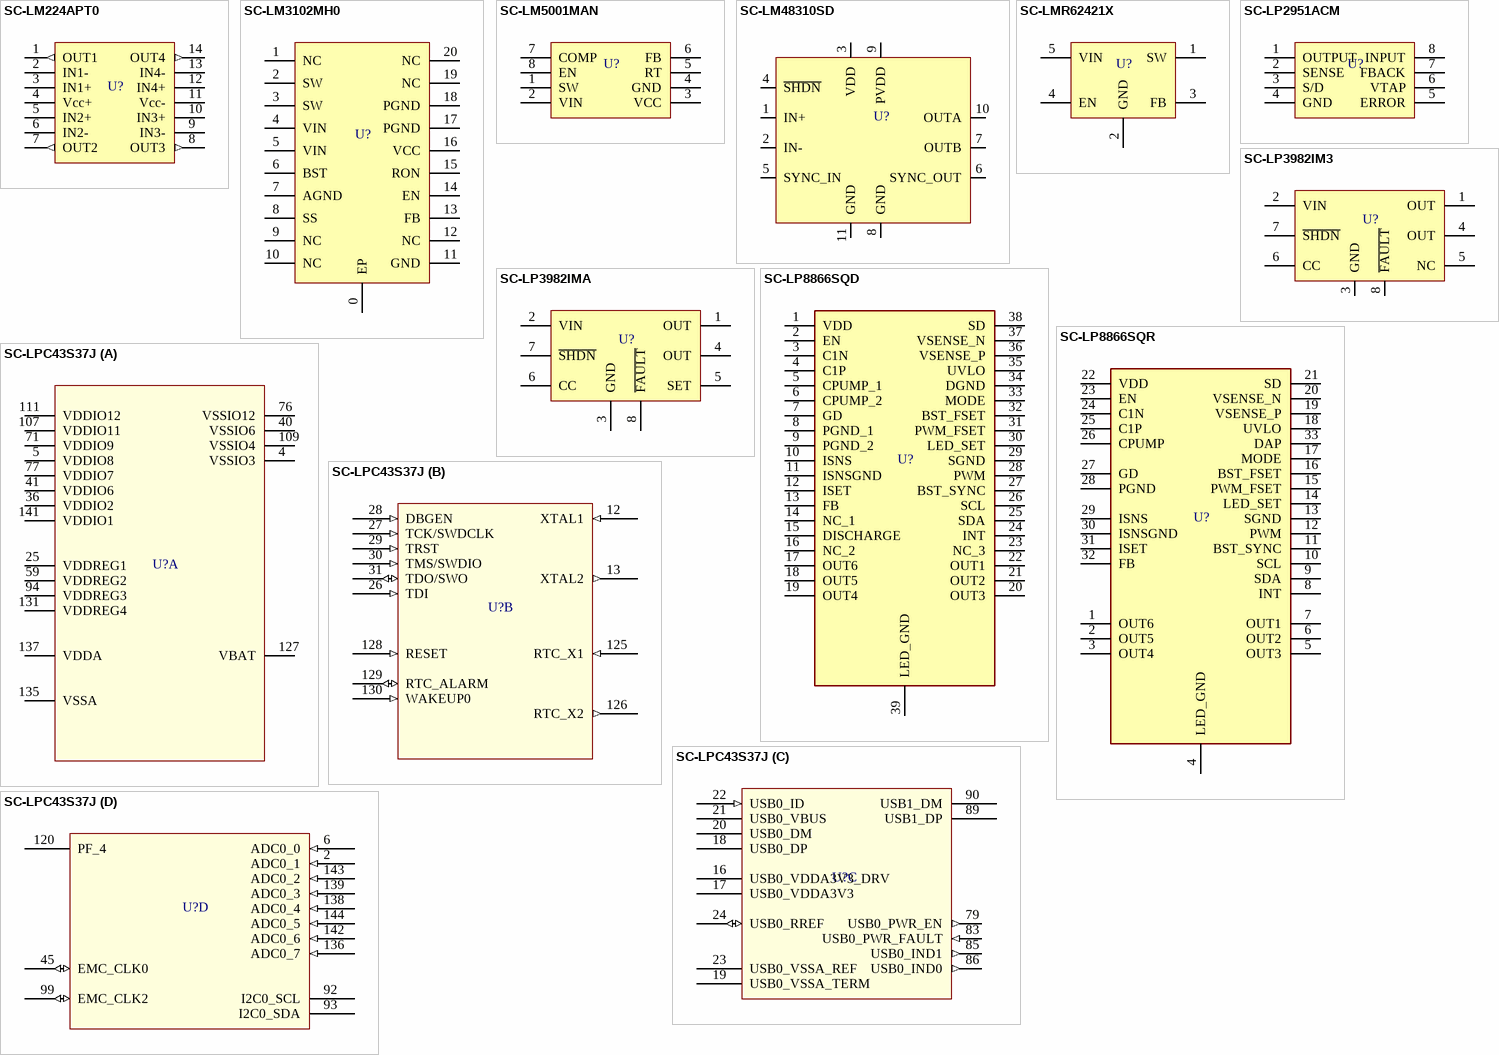
[diagram p17: symbols SC-LM224APT0 to SC-LPC43S37J]